# Altium footprint library uSimar_Components.PcbLib: 17 footprints (part 2 of 2)
Each footprint in its own frame and in the unit in brackets; x right, y up, seen from the top. Pads: shape width x height; smd on the part's side, far side on the other; paste and mask are expansions set on the pad; w line width, h text height; cw(c..) or ccw(c..) is an arc to the next point about the centre after c.
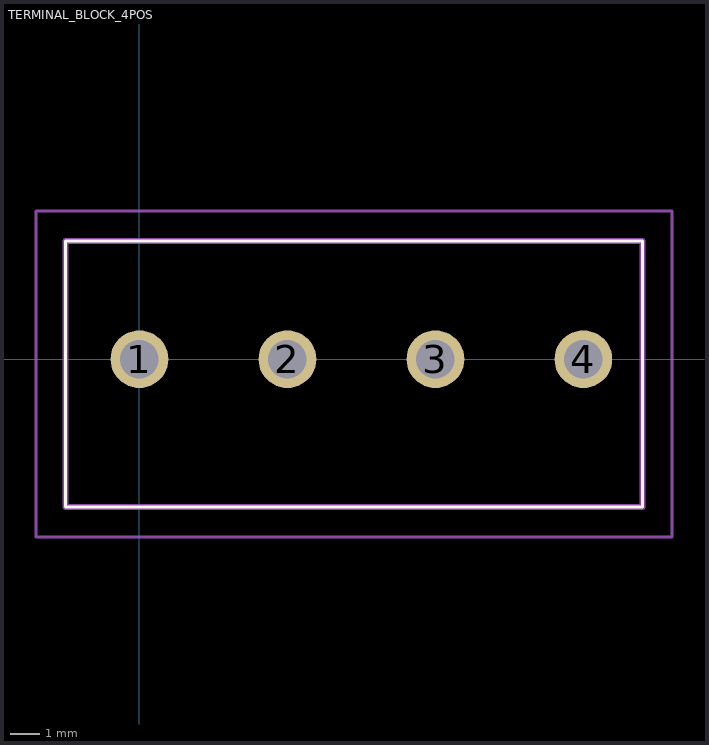
[diagram p1: the footprint, top view; thin cyan lines are the x and y axes]

## TERMINAL_BLOCK_4POS [mm]
pads (4):
  round 1.95 hole 1.3: 1(0,0) 2(5,0) 3(10,0) 4(15,0)
Top Overlay:
  lines w0.1: -2.5,-5 -2.5,4 17,4 17,-5 -2.5,-5
Mechanical 15:
  lines w0.2: -2.5,-5 -2.5,4 17,4 17,-5 -2.5,-5
Mechanical 20:
  lines w0.1: -3.5,-6 -3.5,5 18,5 18,-6 -3.5,-6
3D body "1935187.stp": height 11.4, standoff -3.5, extent -2.517,-5 18.053,4